# Altium footprint library QUTMS-MCISOLibrary.PcbLib: 56 footprints (part 3 of 4)
Each footprint in its own frame and in the unit in brackets; x right, y up, seen from the top. Pads: shape width x height; smd on the part's side, far side on the other; paste and mask are expansions set on the pad; w line width, h text height; cw(c..) or ccw(c..) is an arc to the next point about the centre after c.
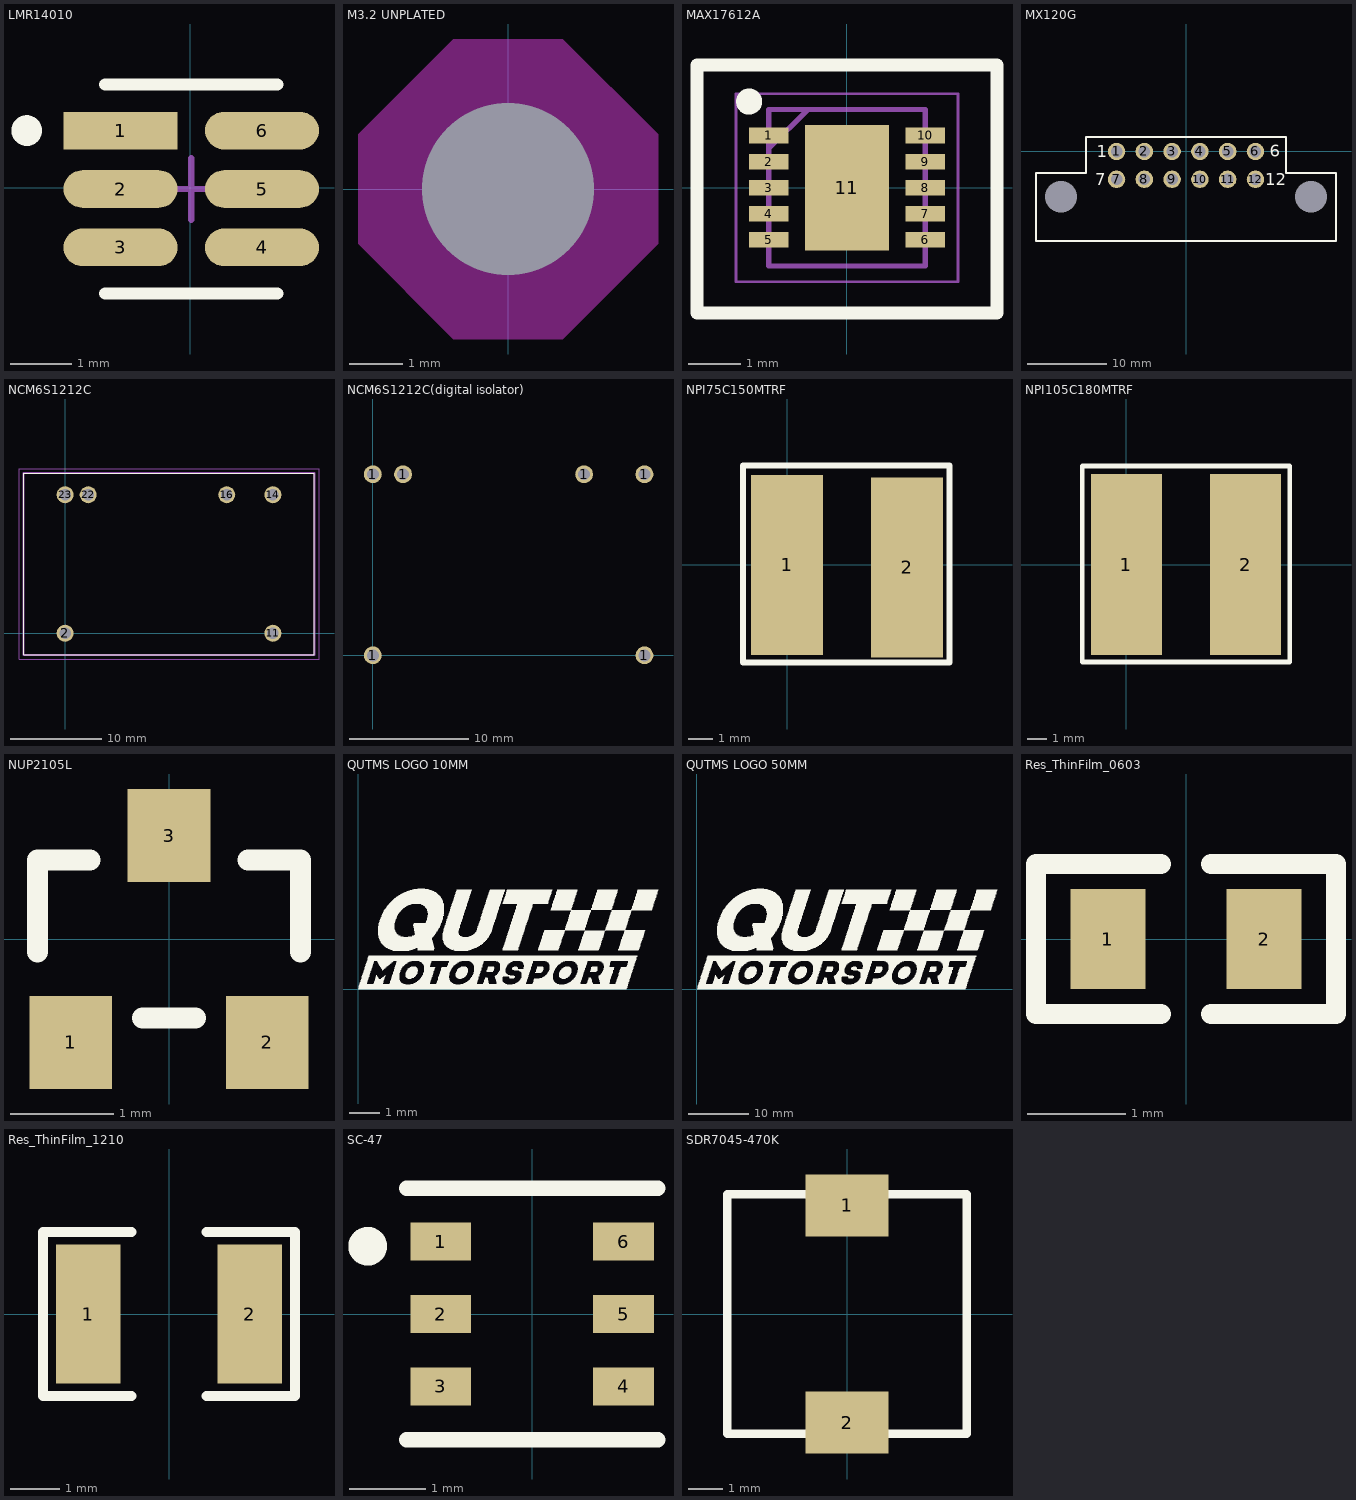
[diagram p2: the footprints below, top view; thin cyan lines are the x and y axes]

## LMR14010 [mm]
pads (6):
  rect 1.854x0.612 smd paste+0 mask+0: 1(-1.136,0.933)
  rrect100% 1.854x0.612 smd paste+0 mask+0: 2(-1.136,-0.017) 3(-1.136,-0.967) 4(1.164,-0.967) 5(1.164,-0.017) 6(1.164,0.933)
Top Overlay:
  circle w0.25: c-2.663,0.933 r0.125
  lines w0.2: -1.386,-1.717 1.414,-1.717 ; -1.386,1.683 1.414,1.683
Mechanical 16:
  lines w0.1: -0.486,-0.017 0.514,-0.017 ; 0.014,-0.517 0.014,0.483
3D body "IC_Texas_Instruments_LMR14010ADDCR_eec.STEP": height 1.1, standoff 0, extent -1.386,-1.467 1.414,1.434

## M3.2 UNPLATED [mm]
pads (1):
  round 0 hole 3.2 unplated mask+2.6: 1(0,0)
Keep-Out Layer:
  region: -2.794,0 -2.794,1.016 -1.016,2.794 0,2.794 0,0
  region: 0,2.794 1.016,2.794 2.794,1.016 2.794,0 0,0
  region: 2.794,0 2.794,-1.016 1.016,-2.794 0,-2.794 0,0
  region: 0,-2.794 -1.016,-2.794 -2.794,-1.016 -2.794,0 0,0

## MAX17612A [mm]
pads (11):
  rect 0.75x0.3 smd: 1(-1.5,1) 2(-1.5,0.5) 3(-1.5,0) 4(-1.5,-0.5) 5(-1.5,-1) 6(1.5,-1) 7(1.5,-0.5) 8(1.5,0) 9(1.5,0.5) 10(1.5,1)
  rect 1.6x2.4 smd: 11(0,0)
Top Overlay:
  circle w0.25: c-1.875,1.65 r0.125
  lines w0.254: -2.873,-2.398 2.873,-2.398 2.873,2.348 -2.873,2.348 -2.873,-2.398
Mechanical 13:
  lines w0.1: -1.5,0.75 -0.75,1.5 ; -1.5,-1.5 -1.5,1.5 1.5,1.5 1.5,-1.5 -1.5,-1.5
Mechanical 15:
  lines w0.05: -2.125,-1.8 -2.125,1.8 2.125,1.8 2.125,-1.8 -2.125,-1.8
3D body "MAX17612AATB+.stp": height 0.8, standoff 0, extent -1.55,-1.5 1.55,1.5

## MX120G [mm]
pads (14):
  round 2.2 hole 1.45: 1(-8.75,0) 2(-5.25,0) 3(-1.75,0) 4(1.75,0) 5(5.25,0) 6(8.75,0) 7(-8.75,-3.5) 8(-5.25,-3.5) 9(-1.75,-3.5) 10(1.75,-3.5) 11(5.25,-3.5) 12(8.75,-3.5)
  round 0 hole 4 mask+0.254: NC(-15.75,-5.7) NC(15.75,-5.7)
Top Overlay:
  lines w0.254: -18.9,-11.25 18.9,-11.25 ; -18.9,-11.2 -18.9,-5.7 -18.9,-2.7 -15.75,-2.7 -12.6,-2.7 -12.6,1.8 12.6,1.8 12.6,-2.7 15.75,-2.7 18.9,-2.7 18.9,-5.7 18.9,-11.2
  text "1" at -11.246,-0.746 h1.52
  text "7" at -11.446,-4.246 h1.52
  text "6" at 10.554,-0.646 h1.52
  text "12" at 9.954,-4.246 h1.52
3D body "143626.stp": height 24.48, standoff -3.14, extent -18.779,-32.1 18.579,0.358

## NCM6S1212C [mm]
pads (6):
  round 1.875 hole 1.25: 2(0,0) 11(22.86,0) 14(22.86,15.24) 16(17.78,15.24) 22(2.54,15.24) 23(0,15.24)
Top Overlay:
  lines w0.1: -4.57,-2.38 -4.57,17.62 27.43,17.62 27.43,-2.38 -4.57,-2.38
Mechanical 13:
  lines w0.2: -4.57,-2.38 -4.57,17.62 27.43,17.62 27.43,-2.38 -4.57,-2.38
Mechanical 15:
  lines w0.1: -5.07,-2.88 -5.07,18.12 27.93,18.12 27.93,-2.88 -5.07,-2.88
3D body "NCM6S1212C.stp": height 10.85, standoff -5, extent -4.57,-2.38 27.43,17.62

## NCM6S1212C(digital isolator) [mm]
pads (6):
  round 1.5 hole 1: 1(0,0) 1(0,15.24) 1(2.54,15.24) 1(17.78,15.24) 1(22.86,0) 1(22.86,15.24)
Multi-Layer:
  lines w0.254: -1.25,-1.275 24,-1.275 24,16.65 -1.25,16.65 -1.25,-1.275

## NPI75C150MTRF [mm]
pads (2):
  rect 3x7.5 smd: 1(0,0) 2(5,-0.1)
Top Overlay:
  lines w0.254: -1.825,-4.075 6.775,-4.075 6.775,4.15 -1.6,4.15 -1.825,4.15 -1.825,-4.075

## NPI105C180MTRF [mm]
pads (2):
  rect 3.75x9.5 smd: 1(0,0) 2(6.25,0)
Top Overlay:
  lines w0.254: -2.325,-5.1 -2.325,5.175 8.575,5.175 8.575,-5.1 -2.325,-5.1

## NUP2105L [mm]
pads (3):
  rect 0.8x0.9 smd: 1(-0.95,-1) 2(0.95,-1) 3(0,1)
Top Overlay:
  lines w0.203: -1.27,-0.127 -1.27,0.762 -0.762,0.762 ; -0.254,-0.762 0.254,-0.762 ; 0.762,0.762 1.27,0.762 1.27,-0.127
3D body "SOT-23-3.stp": height 1, standoff 0, extent -1.448,-1.224 1.452,1.176

## PCBComponent_1 [mm]

## QUTMS LOGO 10MM [mm]
Top Overlay:
  drawing of 14 lines, arcs and shapes, not listed

## QUTMS LOGO 50MM [mm]
Top Overlay:
  drawing of 14 lines, arcs and shapes, not listed

## Res_ThinFilm_0603 [mil]
pads (2):
  rect 30x40 smd: 1(-31.24,0) 2(31.24,0)
Top Overlay:
  lines w8: -10,-30 -60,-30 -60,30 -10,30 ; 10,-30 60,-30 60,30 10,30
3D body "rsmd-0603_l1-6_w0-8_h0-45.stp": height 17.72, standoff 0, extent -31.49,-15.74 31.5,15.75

## Res_ThinFilm_1210 [mm]
pads (2):
  rect 1.3x2.8 smd: 1(-1.625,0) 2(1.625,0)
Top Overlay:
  lines w0.203: -0.762,-1.651 -2.54,-1.651 -2.54,1.651 -0.762,1.651 ; 0.762,-1.651 2.54,-1.651 2.54,1.651 0.762,1.651
3D body "rsmd-1210_l3-2_w2-5_h0-6.stp": height 0.6, standoff 0, extent -1.6,-1.25 1.6,1.25

## SC-47 [mm]
pads (6):
  rect 0.8x0.5 smd: 1(-1.2,0.95) 2(-1.2,0) 3(-1.2,-0.95) 4(1.2,-0.95) 5(1.2,0) 6(1.2,0.95)
Top Overlay:
  circle w0.254: c-2.159,0.889 r0.127
  lines w0.2: -1.651,-1.651 1.651,-1.651 ; -1.651,1.651 1.651,1.651
3D body "SC-74-6.stp": height 1.14, standoff 0.04, extent -1.3,-1.45 1.3,1.45

## SDR7045-470K [mm]
pads (2):
  rect 2.4x1.8 smd: 1(0,3.15) 2(0,-3.15)
Top Overlay:
  lines w0.254: -3.473,-3.473 3.473,-3.473 3.473,3.473 -3.473,3.473 -3.473,-3.473
3D body "SDR7045-470K.stp": height 3.5, standoff -3.5, extent -2,-3.475 2.5,3.525